# Altium footprint library PCBLIB.PcbLib: 775 footprints (part 38 of 49)
Each footprint in its own frame and in the unit in brackets; x right, y up, seen from the top. Pads: shape width x height; smd on the part's side, far side on the other; paste and mask are expansions set on the pad; w line width, h text height; cw(c..) or ccw(c..) is an arc to the next point about the centre after c.
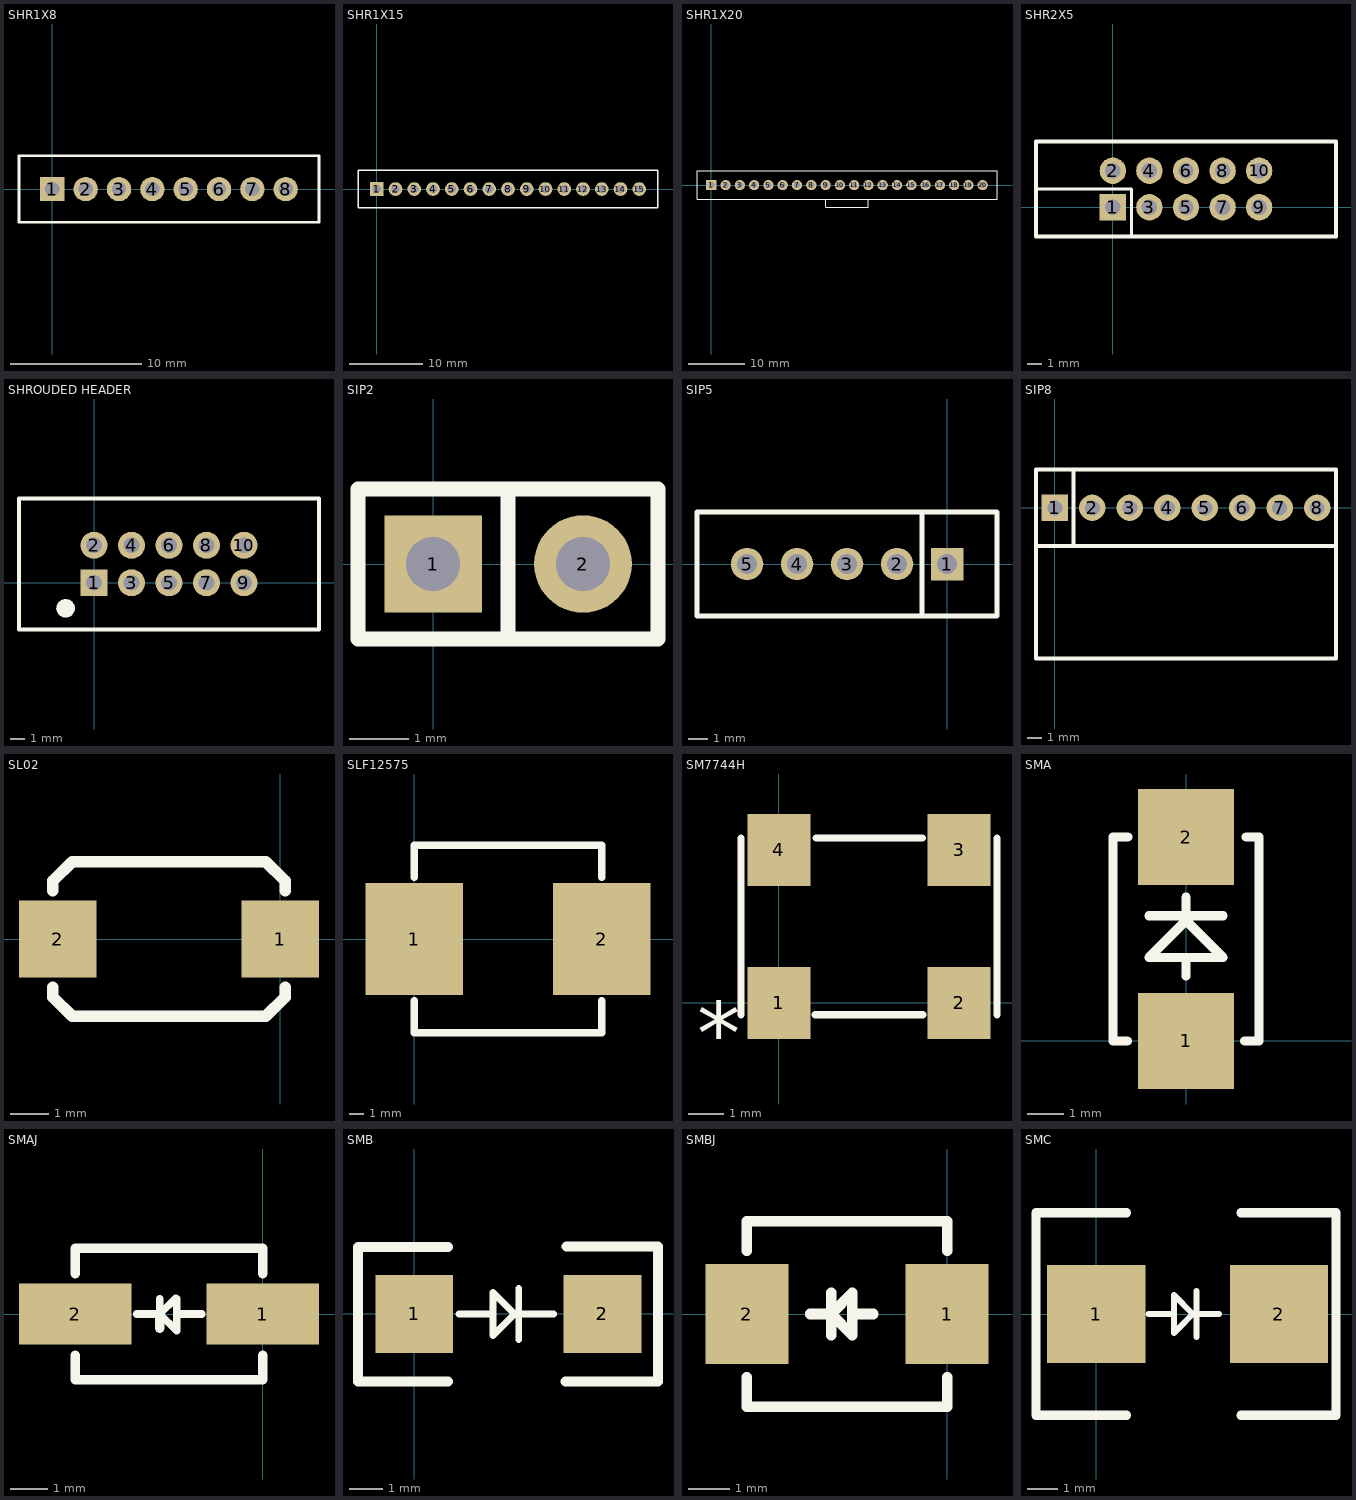
[diagram p37: the footprints below, top view; thin cyan lines are the x and y axes]

## SHR1X8 [mil]
pads (8):
  rect 73x73 hole 43: 1(0,0)
  round 73 hole 43: 2(100,-0.23) 3(200,-0.23) 4(300,-0.23) 5(400,-0.23) 6(500,-0.23) 7(600,-0.23) 8(700,-0.23)
TopOverlay:
  lines w8: -100,-100 -100,100 800,100 800,-100 -100,-100
Mechanical4:
  text ".341" at 0,0 h1

## SHR1X15 [mil]
pads (15):
  rect 73x73 hole 43: 1(0,0)
  round 73 hole 43: 2(100,-0.23) 3(200,-0.23) 4(300,-0.23) 5(400,-0.23) 6(500,-0.23) 7(600,-0.23) 8(700,-0.23) 9(800,-0.23) 10(900,-0.23) 11(1000,-0.23) 12(1100,-0.23) 13(1200,-0.23) 14(1300,-0.23) 15(1400,-0.23)
TopOverlay:
  lines w8: -100,-100 -100,100 1500,100 1500,-100 -100,-100
Mechanical4:
  text ".341" at 0,0 h1

## SHR1X20 [mil]
pads (20):
  rect 72x72 hole 42: 1(0,0)
  round 72 hole 42: 2(100,0) 3(200,0) 4(300,0) 5(400,0) 6(500,0) 7(600,0) 8(700,0) 9(800,0) 10(900,0) 11(1000,0) 12(1100,0) 13(1200,0) 14(1300,0) 15(1400,0) 16(1500,0) 17(1600,0) 18(1700,0) 19(1799.75,0) 20(1900,0)
TopOverlay:
  lines w8: 800,-100 800,-155 1100,-155 1100,-105 ; -100,-100 -100,100 2000,100 2000,-100 -100,-100
Mechanical4:
  text ".341" at 0,0 h1

## SHR2X5 [mil]
pads (10):
  rect 72x72 hole 42: 1(0,0)
  round 72 hole 42: 2(0,100) 3(100,0) 4(100,100) 5(200,0) 6(200,100) 7(300,0) 8(300,100) 9(400,0) 10(400,100)
TopOverlay:
  lines w8: -206.56,50.31 50.99,50.31 50.99,-80
  lines w10: -210,-80 610,-80 610,180 -210,180 -210,-80
Mechanical4:
  text ".550" at 0,0 h1

## SHROUDED HEADER [mil] "SHROUDED HEADER 10 POS STRAIGHT"
height 385
pads (11):
  rect 72x72 hole 42: 1(0,0)
  round 72 hole 42: 2(0,100) 3(100,0) 4(100,100) 5(200,0) 6(200,100) 7(300,0) 8(300,100) 9(400,0) 10(400,100)
  round 50 on Top Overlay: ""(-75.8,-68.27)
TopOverlay:
  lines w10: -200,-125 -200,225 250,225 600,225 600,-125 250,-125 -200,-125
Mechanical4:
  text ".341" at 0,0 h1
  text ".341" at -0.27,0 h1

## SIP2 [mil]
pads (2):
  rect 65x65 hole 36: 1(0,0)
  round 65 hole 36: 2(100,0)
TopOverlay:
  lines w10: 50,-50 50,50 ; -50,-50 -50,50 150,50 150,-50 -50,-50

## SIP5 [mil]
pads (5):
  rect 65x65 hole 40: 1(0,0)
  round 65 hole 40: 2(-100,0) 3(-200,0) 4(-300,0) 5(-400,0)
TopOverlay:
  lines w10: -50,-104 -50,104 ; -500,-104 -500,104 100,104 100,-104 -500,-104
Mechanical4:
  text ".400" at 0,0 h1

## SIP8 [mil]
pads (8):
  rect 70x70 hole 40: 1(0,0)
  round 70 hole 40: 2(100,0) 3(200,0) 4(300,0) 5(400,0) 6(500,0) 7(600,0) 8(700,0)
TopOverlay:
  lines w10: 50,-102 50,102 ; -50,-102 750,-102 ; -50,-102 -50,102 750,102 750,-102 ; -50,-102 -50,-402 750,-402 750,-102
Mechanical4:
  text ".400" at 0,0 h1

## SL02 [mil]
pads (2):
  rect 80x80 smd: 1(0,0) 2(-230,0)
TopOverlay:
  lines w12: -235,-50 -235,-60 -215,-80 -15,-80 5,-60 5,-50 ; -235,50 -235,60 -215,80 -15,80 5,60 5,50
Mechanical4:
  text ".065" at 0,0 h1

## SLF12575 [mil] "Inductor"
height 300
pads (2):
  rect 260x300 smd: 1(0,0) 2(500,0)
TopOverlay:
  lines w20: 0,-165 0,-250 500,-250 500,-165 ; 0,165 0,250 500,250 500,165

## SM7744H [mil]
height 80
pads (4):
  rect 70x80 smd: 1(0,0) 2(200,0) 3(200,170) 4(0,170)
TopOverlay:
  lines w8: -42,-13 -42,183 ; 40,-13 160,-13 ; 41,183 159,183 ; 242,-13 242,183
  text "*" at -91,-68 h70

## SMA [mm]
pads (2):
  rect 2.64x2.64 smd: 1(0,0) 2(0,5.59)
TopOverlay:
  lines w0.254: -1.61,0 -2,0 -2,5.59 -1.6,5.59 ; -1.016,3.431 1.016,3.431 ; 0,1.78 0,2.288 ; 0,3.431 0,3.939 ; 1.61,0 2,0 2,5.59 1.651,5.59 ; -1.016,2.288 0,3.304 1.016,2.288 -1.016,2.288
Mechanical4:
  text ".040" at 0,5.59 h0.03

## SMAJ [mm]
pads (2):
  rect 3.04x1.66 smd: 1(0,0) 2(-5.07,0)
TopOverlay:
  lines w0.203: -3.41,0 -3.038,0 -2.784,0 ; -2.784,0.406 -2.784,0 ; -2.352,0.432 -2.784,0 ; -2.327,0 -1.92,0 -1.644,0 ; -2.327,0.406 -2.327,-0.457 -2.784,0
  lines w0.254: -5.07,-1.118 -5.07,-1.778 0,-1.778 0,-1.118 ; -5.07,1.092 -5.07,1.778 0,1.778 0,1.092 ; -2.784,-0.381 -2.784,0
Mechanical4:
  text ".065" at -5.07,0 h0.03

## SMB [mil]
height 140
pads (2):
  rect 91x91 smd: 1(0,0) 2(220.08,0)
TopOverlay:
  lines w7.8: 122.08,0 163.08,0
  lines w8: 52.08,0 92.08,0 ; 122.08,-30 122.08,30 ; 92.08,0 92.08,-25 97.08,-20 117.08,0 92.08,25 92.08,0
  lines w12: -65.96,-79 39.04,-79 ; -65.92,-79 -65.96,78.48 39.04,78.48 ; 177,-79 285,-79 285.1,79 178,79
Mechanical4:
  text ".105" at 220.08,0 h1

## SMBJ [mm]
pads (2):
  rect 2x2.41 smd: 1(0,0) 2(-4.826,0)
TopOverlay:
  lines w0.254: -4.826,-1.524 -4.826,-2.235 -0.026,-2.235 ; -4.826,1.524 -4.826,2.235 -0.026,2.235 ; -3.302,0 -2.794,0 ; -2.794,-0.508 -2.794,0 ; -2.794,0.508 -2.794,0 ; -1.778,0 -2.286,0 ; 0,-2.235 0,-1.524 ; 0,1.524 0,2.235 ; -2.794,0 -2.286,-0.508 -2.286,0 ; -2.794,0 -2.286,0.508 -2.286,0
Mechanical4:
  text ".105" at -4.826,0 h0.03

## SMC [mil]
pads (2):
  rect 129x129 smd: 1(0,0) 2(240,0)
TopOverlay:
  lines w7.8: 132,0 161.42,0
  lines w8: 68.9,0 102,0 ; 132,-30 132,30 ; 102,0 102,25 127,0 107,-20 102,-25 102,0
  lines w12: 40,-133 -79,-133 -79,133 40,133 ; 315,-132.99 315,132.99
  lines w12.01: 190,-132.99 315,-132.99 ; 190,132.99 315,132.99
Mechanical4:
  text ".105" at 240,0 h1